# Altium footprint library IceZumAlhambra.PcbLib: 1 footprints
Each footprint in its own frame and in the unit in brackets; x right, y up, seen from the top. Pads: shape width x height; smd on the part's side, far side on the other; paste and mask are expansions set on the pad; w line width, h text height; cw(c..) or ccw(c..) is an arc to the next point about the centre after c.
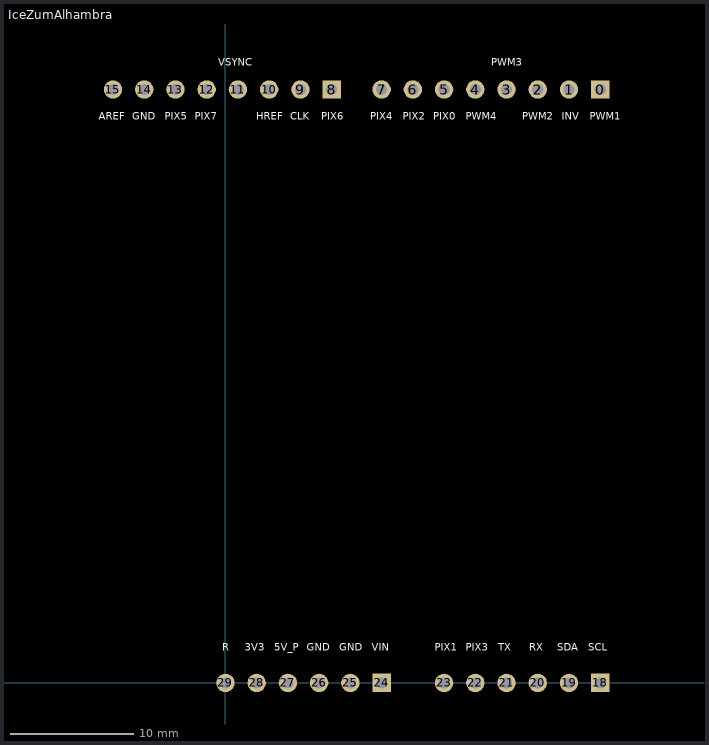
[diagram p0: the footprint, top view; thin cyan lines are the x and y axes]

## IceZumAlhambra [mm]
pads (28):
  rect 1.5x1.5 hole 0.9: 0(30.48,48.26) 8(8.636,48.26) 18(30.48,0) 24(12.7,0)
  round 1.5 hole 0.9: 1(27.94,48.26) 2(25.4,48.26) 3(22.86,48.26) 4(20.32,48.26) 5(17.78,48.26) 6(15.24,48.26) 7(12.7,48.26) 9(6.096,48.26) 10(3.556,48.26) 11(1.016,48.26) 12(-1.524,48.26) 13(-4.064,48.26) 14(-6.604,48.26) 15(-9.144,48.26) 19(27.94,0) 20(25.4,0) 21(22.86,0) 22(20.32,0) 23(17.78,0) 25(10.16,0) 26(7.62,0) 27(5.08,0) 28(2.54,0) 29(0,0)
Top Overlay:
  text "PWM1" at 29.64,45.6 h1
  text "PIX7" at -2.5,45.6 h1
  text "HREF" at 2.52,45.6 h1
  text "PIX6" at 7.8,45.6 h1
  text "PIX2" at 14.4,45.6 h1
  text "PWM4" at 19.56,45.6 h1
  text "PWM2" at 24.12,45.6 h1
  text "3V3" at 1.56,2.4 h1
  text "5V_P" at 3.96,2.4 h1
  text "VIN" at 11.88,2.4 h1
  text "PIX3" at 19.56,2.4 h1
  text "PIX1" at 17.04,2.4 h1
  text "TX" at 22.2,2.4 h1
  text "RX" at 24.72,2.4 h1
  text "SDA" at 27,2.4 h1
  text "GND" at 9.24,2.4 h1
  text "GND" at 6.6,2.4 h1
  text "SCL" at 29.52,2.4 h1
  text "R" at -0.24,2.4 h1
  text "GND" at -7.56,45.6 h1
  text "PIX4" at 11.76,45.6 h1
  text "PIX0" at 16.92,45.6 h1
  text "PWM3" at 21.63,50 h1
  text "INV" at 27.36,45.6 h1
  text "VSYNC" at -0.6,50 h1
  text "PIX5" at -4.92,45.6 h1
  text "AREF" at -10.32,45.6 h1
  text "CLK" at 5.28,45.6 h1
3D body "Pins.SLDPRT": height 0, standoff -50.9, extent 34.1,21.2 82.1,44
3D body: height 0.25, standoff -7, extent 18,31.5 18,31.5
3D body "Pins6.SLDPRT": height 11, standoff -11.8, extent 16.4,-1.25 32.2,1.25
3D body "Pins6.SLDPRT": height 11, standoff -11.8, extent -1.6,-1.25 14.2,1.25
3D body "Pins8.SLDPRT": height 11, standoff -11.8, extent -10.4,47.25 10.4,49.75
3D body "Pins8.SLDPRT": height 11, standoff -11.8, extent 11.1,47.25 31.9,49.75